# Altium footprint library CUSTOM PCB.PcbLib: 404 footprints (part 11 of 26)
Each footprint in its own frame and in the unit in brackets; x right, y up, seen from the top. Pads: shape width x height; smd on the part's side, far side on the other; paste and mask are expansions set on the pad; w line width, h text height; cw(c..) or ccw(c..) is an arc to the next point about the centre after c.
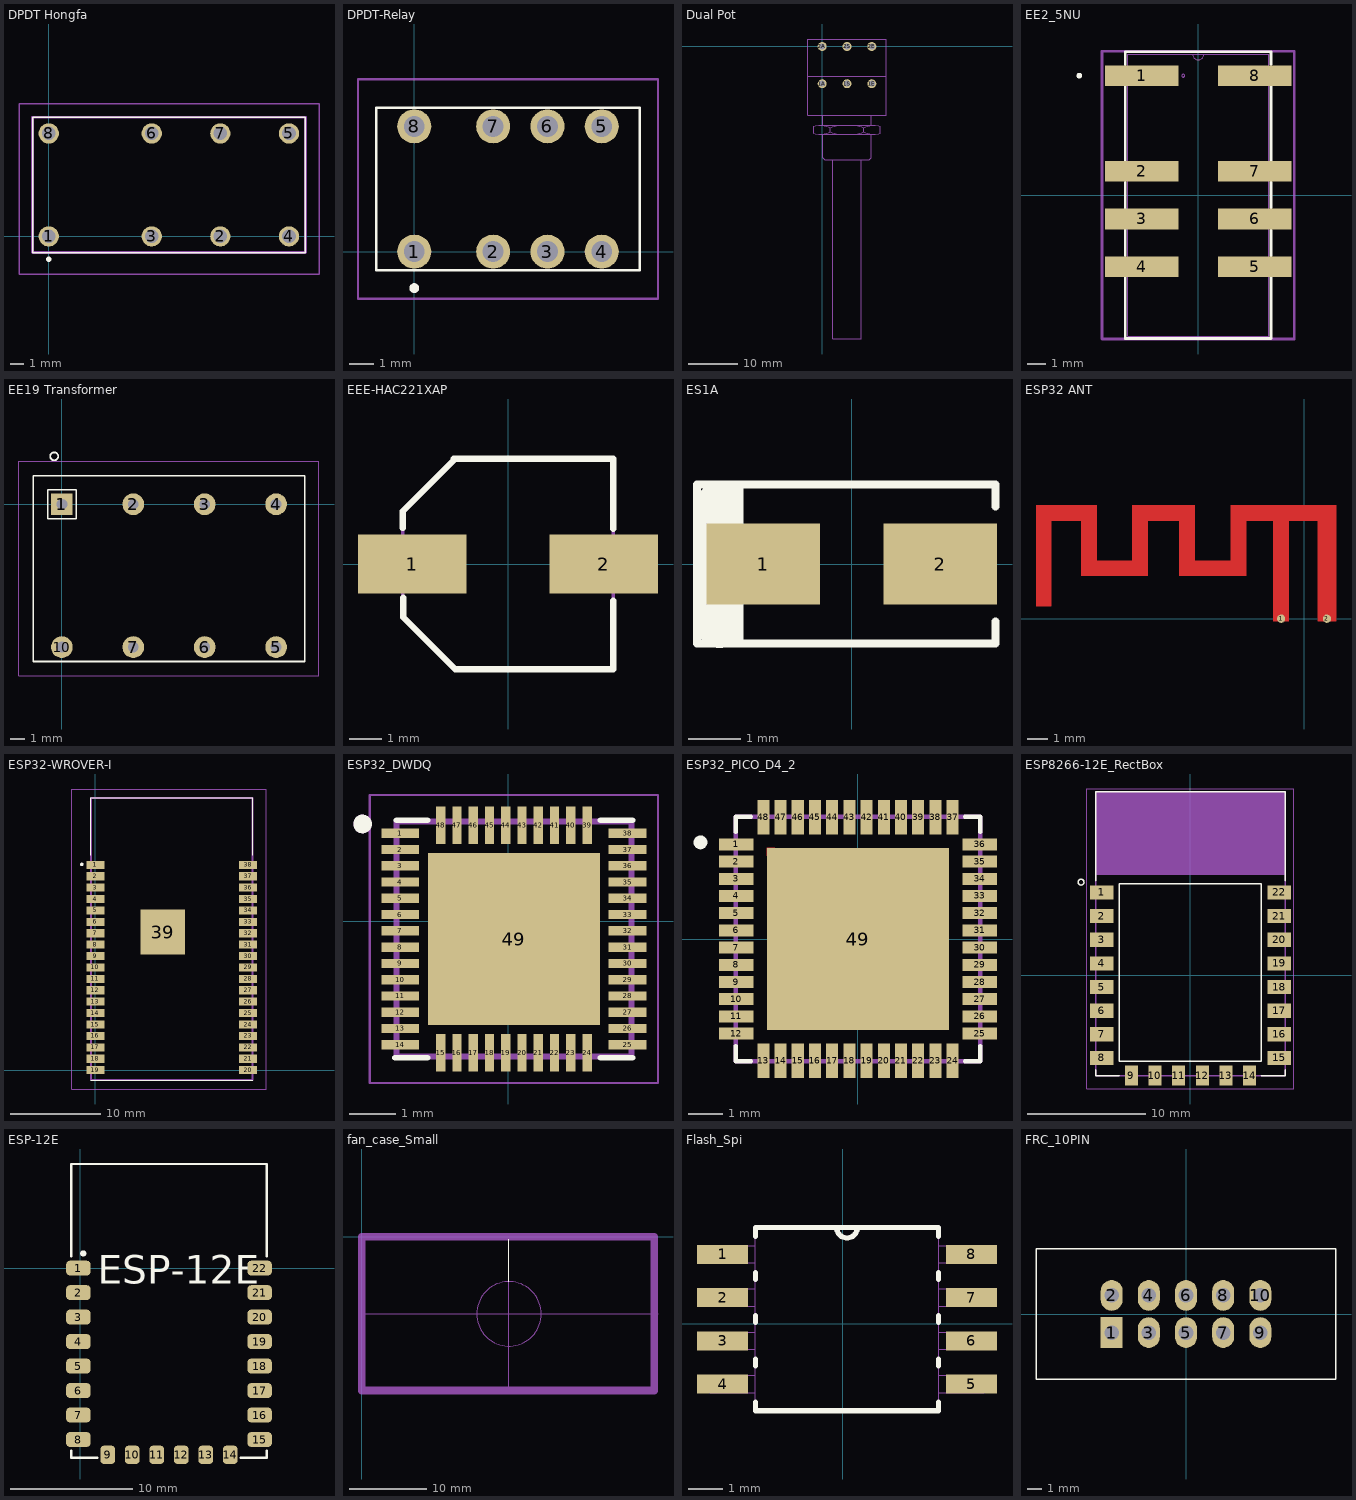
[diagram p10: the footprints below, top view; thin cyan lines are the x and y axes]

## DPDT Hongfa [mm]
pads (8):
  round 1.5 hole 1: 1(0,0) 2(12.7,0) 3(7.62,0) 4(17.78,0) 5(17.78,7.62) 6(7.62,7.62) 7(12.7,7.62) 8(0,7.62)
Top Overlay:
  lines w0.1: -1.2,-1.19 -1.2,8.81 19,8.81 19,-1.19 -1.2,-1.19
  lines w0.2: -0.1,-1.69 ccw(c0,-1.69) 0.1,-1.69 ccw(c0,-1.69) -0.1,-1.69
Mechanical 15:
  lines w0.2: -1.2,-1.19 -1.2,8.81 19,8.81 19,-1.19 -1.2,-1.19
Mechanical 20:
  lines w0.1: -2.2,-2.79 -2.2,9.81 20,9.81 20,-2.79 -2.2,-2.79
3D body: height 11.48, standoff 0, extent -1.209,-1.189 19.009,8.819

## DPDT-Relay [mm] "Signal relay kemet uc 2"
pads (8):
  round 1.381 hole 0.85: 1(0,0) 2(3.2,0) 3(5.4,0) 4(7.6,0) 5(7.6,5.08) 6(5.4,5.08) 7(3.2,5.08) 8(0,5.08)
Top Overlay:
  lines w0.1: -1.534,-0.762 9.134,-0.762 9.134,5.842 -1.534,5.842 -1.534,-0.762
  lines w0.2: -0.1,-1.478 cw(c0,-1.478) 0.1,-1.478 cw(c0,-1.478) -0.1,-1.478
Mechanical 20:
  lines w0.1: -2.28,-1.905 9.88,-1.905 9.88,6.985 -2.28,6.985 -2.28,-1.905
3D body: height 5.3, standoff 0, extent -1.524,-0.762 9.144,5.842

## Dual Pot [mm] "dual gang pot"
pads (6):
  round 1.8 / inner round 1.524 / far side round 1.8 hole 1.2: 1A(0,-7.5) 1E(10,-7.5) 1S(5,-7.5) 2A(0,0) 2E(10,0) 2S(5,0)
Mechanical 22:
  lines w0.203: 2.1,-22.9 2.1,-58.9 7.9,-58.9 7.9,-22.9 ; -2.9,-6 12.9,-6 ; -2.9,-6 -2.9,-13.9 0.1,-13.9 ; -2.9,-6 -2.9,1.5 12.9,1.5 12.9,-6 ; -0.4,-17.7 0.1,-17.7 ; -0.4,-17.7 -0.7,-17.7 -1.4,-17.6 -1.7,-17.5 -1.7,-16.1 -1.4,-16 -0.7,-15.9 -0.4,-15.9 ; -0.4,-17.7 0.4,-17.6 1.2,-17.4 1.6,-17.2 ; -0.4,-15.9 0.1,-15.9 ; -0.4,-15.9 0.4,-16 1.2,-16.2 1.6,-16.4 ; 0.1,-17.7 0.1,-22.4 0.5,-22.8 9.5,-22.8 9.9,-22.4 9.9,-17.7 ; 0.1,-17.7 3.6,-17.7 ; 0.1,-15.9 0.1,-13.9 ; 0.1,-15.9 3.6,-15.9 ; 0.1,-13.9 9.9,-13.9 ; 1.6,-17.2 2,-17.4 2.8,-17.6 3.6,-17.7 ; 1.6,-17.2 1.6,-16.4 ; 1.6,-16.4 2,-16.2 2.8,-16 3.6,-15.9 ; 3.6,-17.7 6.4,-17.7 ; 3.6,-15.9 6.4,-15.9 ; 6.4,-17.7 9.9,-17.7 ; 6.4,-17.7 7.2,-17.6 8,-17.4 8.4,-17.2 ; 6.4,-15.9 9.9,-15.9 ; 6.4,-15.9 7.2,-16 8,-16.2 8.4,-16.4 ; 8.4,-17.2 8.8,-17.4 9.6,-17.6 10.4,-17.7 ; 8.4,-17.2 8.4,-16.4 ; 8.4,-16.4 8.8,-16.2 9.6,-16 10.4,-15.9 ; 9.9,-17.7 10.4,-17.7 ; 9.9,-15.9 9.9,-13.9 ; 9.9,-15.9 10.4,-15.9 ; 9.9,-13.9 12.9,-13.9 12.9,-6.4 12.9,-6 ; 10.4,-17.7 10.7,-17.7 11.4,-17.6 11.7,-17.5 11.7,-16.1 11.4,-16 10.7,-15.9 10.4,-15.9

## EE2_5NU [mm] "Fan_Relay"
pads (8):
  rect 3.903x1.11 smd paste+0 mask+0: 1(-3.002,6.35) 2(-3.002,1.27) 3(-3.002,-1.27) 4(-3.002,-3.81) 5(3.002,-3.81) 6(3.002,-1.27) 7(3.002,1.27) 8(3.002,6.35)
Top Overlay:
  circle w0.152: c-6.325,6.35 r0.076
  lines w0.152: -3.877,-4.397 -3.877,-7.627 3.877,-7.627 3.877,-4.397 ; -3.877,-3.223 -3.877,-1.857 ; -3.877,-0.683 -3.877,0.683 ; -3.877,1.857 -3.877,5.763 ; -3.877,6.937 -3.877,7.627 3.877,7.627 3.877,6.937 ; 3.877,-3.223 3.877,-1.857 ; 3.877,-0.683 3.877,0.683 ; 3.877,1.857 3.877,5.763
Mechanical 13:
  circle w0: c-0.796,6.35 r0.076
  lines w0: -0.305,7.5 ccw(c0,7.5) 0.305,7.5
  lines w0.025: -4.75,-4.064 -4.75,-3.556 -3.75,-3.556 -3.75,-4.064 -4.75,-4.064 ; -4.75,-1.524 -4.75,-1.016 -3.75,-1.016 -3.75,-1.524 -4.75,-1.524 ; -4.75,1.016 -4.75,1.524 -3.75,1.524 -3.75,1.016 -4.75,1.016 ; -4.75,6.096 -4.75,6.604 -3.75,6.604 -3.75,6.096 -4.75,6.096 ; -3.75,-7.5 3.75,-7.5 3.75,7.5 -3.75,7.5 -3.75,-7.5 ; 3.75,-4.064 3.75,-3.556 4.75,-3.556 4.75,-4.064 3.75,-4.064 ; 3.75,-1.524 3.75,-1.016 4.75,-1.016 4.75,-1.524 3.75,-1.524 ; 3.75,1.016 3.75,1.524 4.75,1.524 4.75,1.016 3.75,1.016 ; 3.75,6.096 3.75,6.604 4.75,6.604 4.75,6.096 3.75,6.096
Mechanical 15:
  lines w0.152: -5.106,-7.652 -5.106,7.652 5.106,7.652 5.106,-7.652 -5.106,-7.652
3D body "User Library-EE2-5NU.STEP": height 10.14, standoff 0.14, extent -4.75,-7.38 4.75,7.62

## EE19 Transformer [mil] "DC/DC  converter"
pads (8):
  rect 60x60 hole 30: 1(0,0)
  round 60 hole 30: 2(196.85,0) 3(393.7,0) 4(590.55,0) 5(590.55,-393.7) 6(393.7,-393.7) 7(196.85,-393.7) 10(0,-393.7)
Top Overlay:
  circle w5: c-21,132 r11
  lines w3.94: -39.37,-39.37 39.37,-39.37 39.37,39.37 -39.37,39.37 -39.37,-39.37
  lines w5: -78.74,-433.07 -78.74,78.74 669.29,78.74 669.29,-433.07 -78.74,-433.07
Mechanical 1:
  lines w0.39: -118.11,-472.44 -118.11,118.11 708.66,118.11 708.66,-472.44 -118.11,-472.44
3D body: height 393.7, standoff 0, extent -118.11,-472.44 708.66,118.11
3D body: height 394.09, standoff 0, extent -120.35,-240.31 711.18,-102.64

## EEE-HAC221XAP [mm]
pads (2):
  rect 3.4x1.85 smd: 1(-3,0) 2(3,0)
Top Overlay:
  lines w0.2: -3.299,1.129 -3.299,1.653 -1.7,3.252 ; -3.281,-1.058 -3.281,-1.669 -1.65,-3.3 3.3,-3.3 3.3,-1.146 ; -1.7,3.3 3.3,3.3 3.3,1.106
Mechanical 13:
  lines w0.1: -3.3,-1.65 -1.65,-3.3 3.3,-3.3 3.3,3.3 -1.65,3.3 -3.3,1.65 -3.3,-1.65
3D body "User Library-ALU-D8.STEP": height 7.7, standoff 0, extent -3.5,-3.3 3.5,3.3

## ES1A [mil]
pads (2):
  rect 86x61 smd paste+0 mask+0: 1(-67,0) 2(67,0)
Top Overlay:
  lines w6: -117,32 -117,60 ; -109,60 109,60 109,43.6 ; -100,-46 -100,-49 -89,-60 109,-60 109,-43.6 ; -100,60 -117,60 ; -85,60 -85,-60 -117,-60 -117,60
  lines w35: -100,-46 -100,45
3D body "SMASeries.step": height 92.01, standoff 0, extent -104.02,-55 104.02,55

## ESP32 ANT [mm]
pads (2):
  round 0.4 smd paste-0.2: 1(-1.118,0) 2(1.118,0)
Top Layer:
  region: -1.495,-0.114 -0.741,-0.114 -0.741,4.786 0.678,4.786 0.678,-0.114 1.559,-0.114 1.559,5.54 -3.569,5.54 -3.569,2.84 -5.326,2.84 -5.326,5.54 -8.38,5.54 -8.38,2.84 -10.126,2.84 -10.126,5.54 -13.08,5.54 -13.08,0.612 -12.326,0.612 -12.326,4.786 -10.88,4.786 -10.88,2.086 -7.626,2.086 -7.626,4.786 -6.08,4.786 -6.08,2.086 -2.815,2.086 -2.815,4.786 -1.495,4.786

## ESP32-WROVER-I [mm]
pads (39):
  rect 2x0.9 smd: 1(0,22.86) 2(0,21.59) 3(0,20.32) 4(0,19.05) 5(0,17.78) 6(0,16.51) 7(0,15.24) 8(0,13.97) 9(0,12.7) 10(0,11.43) 11(0,10.16) 12(0,8.89) 13(0,7.62) 14(0,6.35) 15(0,5.08) 16(0,3.81) 17(0,2.54) 18(0,1.27) 19(0,0) 20(17,0) 21(17,1.27) 22(17,2.54) 23(17,3.81) 24(17,5.08) 25(17,6.35) 26(17,7.62) 27(17,8.89) 28(17,10.16) 29(17,11.43) 30(17,12.7) 31(17,13.97) 32(17,15.24) 33(17,16.51) 34(17,17.78) 35(17,19.05) 36(17,20.32) 37(17,21.59) 38(17,22.86)
  rect 5x5 smd: 39(7.5,15.36)
Top Overlay:
  lines w0.1: -0.5,-1.1 17.5,-1.1 ; -0.5,23.95 -0.5,30.3 17.5,30.3 17.5,23.95
  lines w0.2: -1.5,22.8 cw(c-1.5,22.9) -1.5,23 cw(c-1.5,22.9) -1.5,22.8
Mechanical 15:
  lines w0.2: -0.5,-1.1 -0.5,30.3 17.5,30.3 17.5,-1.1 -0.5,-1.1
Mechanical 20:
  lines w0.1: -2.6,-2.1 -2.6,31.3 19,31.3 19,-2.1 -2.6,-2.1
3D body "ESP32-WROVER-B (16MB)--3DModel-STEP-1.STEP": height 3.4, standoff 0, extent -0.427,-1.158 17.573,30.242

## ESP32_DWDQ [mm] "Esp32 dowd SoC"
pads (49):
  rect 0.81x0.2 smd: 1(-2.318,1.894) 2(-2.318,1.544) 3(-2.318,1.194) 4(-2.318,0.844) 5(-2.318,0.494) 6(-2.318,0.144) 7(-2.318,-0.206) 8(-2.318,-0.556) 9(-2.318,-0.906) 10(-2.318,-1.256) 11(-2.318,-1.606) 12(-2.318,-1.956) 13(-2.318,-2.306) 14(-2.318,-2.656) 25(2.572,-2.656) 26(2.572,-2.306) 27(2.572,-1.956) 28(2.572,-1.606) 29(2.572,-1.256) 30(2.572,-0.906) 31(2.572,-0.556) 32(2.572,-0.206) 33(2.572,0.144) 34(2.572,0.494) 35(2.572,0.844) 36(2.572,1.194) 37(2.572,1.544) 38(2.572,1.894)
  rect 0.2x0.81 smd: 15(-1.448,-2.826) 16(-1.098,-2.826) 17(-0.748,-2.826) 18(-0.398,-2.826) 19(-0.048,-2.826) 20(0.302,-2.826) 21(0.652,-2.826) 22(1.002,-2.826) 23(1.352,-2.826) 24(1.702,-2.826) 39(1.702,2.064) 40(1.352,2.064) 41(1.002,2.064) 42(0.652,2.064) 43(0.302,2.064) 44(-0.048,2.064) 45(-0.398,2.064) 46(-0.748,2.064) 47(-1.098,2.064) 48(-1.448,2.064)
  rect 3.7x3.7 smd: 49(0.127,-0.381)
Top Overlay:
  circle w0.2: c-3.128,2.094 r0.1
  lines w0.127: -2.428,-2.936 -1.733,-2.936 ; -2.403,2.174 -1.733,2.174 ; 1.987,-2.936 2.682,-2.936 ; 1.987,2.174 2.682,2.174
Top Paste:
  region: 0.353,1.014 1.522,1.014 1.522,-0.155 0.353,-0.155
  region: -1.273,1.014 -0.098,1.014 -0.098,-0.155 -1.273,-0.155
  region: -1.271,-0.606 -0.098,-0.606 -0.098,-1.779 -1.271,-1.779
  region: 0.353,-0.606 1.522,-0.606 1.522,-1.779 0.353,-1.779
Mechanical 1:
  circle w0.2: c-3.128,2.094 r0.1
  lines w0.127: -2.403,-2.911 2.657,-2.911 2.657,2.149 -2.403,2.149 -2.403,-2.911
Mechanical 4:
  lines w0.05: -2.973,-3.481 3.227,-3.481 3.227,2.719 -2.973,2.719 -2.973,-3.481
3D body "ESP32-D0WDQ6--3DModel-STEP-56544.STEP": height 0.85, standoff -0.05, extent -2.873,-3.381 3.127,2.619

## ESP32_PICO_D4_2 [mm]
pads (49):
  rect 1x0.35 smd: 1(-3.54,2.75) 2(-3.54,2.25) 3(-3.54,1.75) 4(-3.54,1.25) 5(-3.54,0.75) 6(-3.54,0.25) 7(-3.54,-0.25) 8(-3.54,-0.75) 9(-3.54,-1.25) 10(-3.54,-1.75) 11(-3.54,-2.25) 12(-3.54,-2.75) 25(3.54,-2.75) 26(3.54,-2.25) 27(3.54,-1.75) 28(3.54,-1.25) 29(3.54,-0.75) 30(3.54,-0.25) 31(3.54,0.25) 32(3.54,0.75) 33(3.54,1.25) 34(3.54,1.75) 35(3.54,2.25) 36(3.54,2.75)
  rect 0.35x1 smd: 13(-2.75,-3.54) 14(-2.25,-3.54) 15(-1.75,-3.54) 16(-1.25,-3.54) 17(-0.75,-3.54) 18(-0.25,-3.54) 19(0.25,-3.54) 20(0.75,-3.54) 21(1.25,-3.54) 22(1.75,-3.54) 23(2.25,-3.54) 24(2.75,-3.54) 37(2.75,3.54) 38(2.25,3.54) 39(1.75,3.54) 40(1.25,3.54) 41(0.75,3.54) 42(0.25,3.54) 43(-0.25,3.54) 44(-0.75,3.54) 45(-1.25,3.54) 46(-1.75,3.54) 47(-2.25,3.54) 48(-2.75,3.54)
  rect 5.3x5.3 smd: 49(0,0)
Top Layer:
  pour cut-out: -2.652,2.422 -2.423,2.651 -2.653,2.651
Top Overlay:
  circle w0.2: c-4.578,2.808 r0.1
  lines w0.127: -3.55,-3.11 -3.55,-3.55 -3.11,-3.55 ; -3.55,3.11 -3.55,3.55 -3.11,3.55 ; 3.11,-3.55 3.55,-3.55 3.55,-3.11 ; 3.11,3.55 3.55,3.55 3.55,3.11
Top Paste:
  region: -1.166,1.162 1.162,1.162 1.162,-1.166 -1.166,-1.166
Mechanical 1:
  lines w0.127: -3.55,-3.55 3.55,-3.55 3.55,3.55 -3.55,3.55 -3.55,-3.55
3D body "esp32picolow.SLDPRT": height 0.26, standoff -0.01, extent -3.5,-3.5 3.5,3.5

## ESP8266-12E_RectBox [mm] "ESP-12E Rectangular Box"
pads (22):
  rect 2x1.2 smd: 1(-7.5,7) 2(-7.5,5) 3(-7.5,3) 4(-7.5,1) 5(-7.5,-1) 6(-7.5,-3) 7(-7.5,-5) 8(-7.5,-7) 15(7.5,-7) 16(7.5,-5) 17(7.5,-3) 18(7.5,-1) 19(7.5,1) 20(7.5,3) 21(7.5,5) 22(7.5,7)
  rect 1.1x1.7 smd: 9(-5,-8.5) 10(-3,-8.5) 11(-1,-8.5) 12(1,-8.5) 13(3,-8.5) 14(5,-8.5)
Top Overlay:
  circle w0.127: c-9.25,7.875 r0.25
  lines w0.127: -8,-8 -8,-8.5 -6,-8.5 ; -8,8 -8,15.5 8,15.5 8,8 ; 6,-8.5 8,-8.5 8,-8 ; -6,-7.26 6,-7.26 6,7.74 -6,7.74 -6,-7.26
Mechanical 1:
  region: -8.006,15.5 8,15.5 8,8.507 -8.006,8.507
  region: -8.004,15.5 8,15.5 8,8.504 -8.004,8.504
  lines w0.05: -8.75,-9.625 8.75,-9.625 8.75,15.75 -8.75,15.75 -8.75,-9.625
  lines w0.127: -8,-8.5 8,-8.5 8,15.5 -8,15.5 -8,-8.5
3D body: height 5, standoff 0, extent -8.75,-9.625 8.75,15.75

## ESP-12E [mm]
pads (22):
  rrect50% 2x1.2 smd: 1(-0.15,0) 2(-0.15,-2) 3(-0.15,-4) 4(-0.15,-6) 5(-0.15,-8) 6(-0.15,-10) 7(-0.15,-12) 8(-0.15,-14) 15(14.65,-14) 16(14.65,-12) 17(14.65,-10) 18(14.65,-8) 19(14.65,-6) 20(14.65,-4) 21(14.65,-2) 22(14.65,0)
  rrect50% 1.2x1.5 smd: 9(2.25,-15.25) 10(4.25,-15.25) 11(6.25,-15.25) 12(8.25,-15.25) 13(10.25,-15.25) 14(12.25,-15.25)
Top Overlay:
  circle w0.254: c0.25,1.2 r0.127
  lines w0.2: -0.75,-14.925 -0.75,-15.5 1.4,-15.5 ; -0.75,0.975 -0.75,8.5 15.25,8.5 15.25,0.975 ; 13.125,-15.5 15.25,-15.5 15.25,-14.925
  text "ESP-12E" at 1.425,-2.075 h4
3D body "ESP-12E.stp": height 3.01, standoff 0, extent -0.76,-15.51 15.26,8.5

## fan_case_Small [mm]
Top Overlay:
  lines w0.127: 19.101,-5.842 19.101,-0.33
Mechanical 2:
  circle w0.1: c19.152,-10.033 r4.2
  lines w0.127: -0.508,-10.033 38.557,-10.033 ; 19.152,-20.523 19.152,0.432
Mechanical 8:
  lines w0.127: 0,-20.015 0,-19.66
  lines w1: 0,-20.015 38.075,-20.015 38.075,0 0,0 0,-19.66
3D body: height 39, standoff 0, extent -0.508,-0.483 38.583,0.483
3D body: height 39, standoff 0, extent -0.508,-20.523 38.583,-19.558
3D body: height 39, standoff 0, extent 37.567,-19.558 38.583,-0.483
3D body: height 39, standoff 0, extent -0.508,-19.558 0.508,-0.483
3D body: height 2.4, standoff 0, extent 19.152,-5.842 19.152,-5.842
3D body: height 2.4, standoff 0, extent 19.152,-5.842 19.152,-5.842
3D body: height 1.27, standoff 0, extent 0.533,-19.507 37.592,-0.432

## Flash_Spi [mil] "Flash memory 4mb Sop8"
pads (8):
  rect 59x22 smd: 1(-139,80) 2(-139,30) 3(-139,-20) 4(-139,-70) 5(149,-70) 6(149,-20) 7(149,30) 8(149,80)
Top Overlay:
  lines w6: -101,-91 -101,-101 111,-101 111,-91 ; -101,-49 -101,-41 ; -101,1 -101,9 ; -101,51 -101,59 ; -101,101 -101,111 -7,111 ; 111,-49 111,-41 ; 111,1 111,9 ; 111,51 111,59 ; 111,101 111,111 17,111 ; -7,111 ccw(c5,111) 17,111 ; -7,111 17,111
Mechanical 1:
  lines w0: -7,111 ccw(c5,111) 17,111 ; -7,111 -101,111 -101,-101 111,-101 111,111 17,111 ; -7,111 17,111 ; -154,-80 -101,-80 -101,-60 -154,-60 -154,-80 ; -154,-30 -101,-30 -101,-10 -154,-10 -154,-30 ; -154,20 -101,20 -101,40 -154,40 -154,20 ; -154,70 -101,70 -101,90 -154,90 -154,70 ; 111,-80 164,-80 164,-60 111,-60 111,-80 ; 111,-30 164,-30 164,-10 111,-10 111,-30 ; 111,20 164,20 164,40 111,40 111,20 ; 111,70 164,70 164,90 111,90 111,70
3D body "User Library-so8-3.STEP": height 63.43, standoff -3.5, extent -113.11,-91.46 123.11,101.46
3D body "User Library-so8-3.STEP": height 66.93, standoff 0, extent -113.11,-91.46 123.11,101.46
3D body: height 10, standoff 0, extent -40,60 -40,60
3D body: height 10, standoff 0, extent -40,60 -40,60

## FRC_10PIN [mm]
pads (10):
  rect 1.5x2.1 hole 1: 1(-5.08,-1.27)
  oval 1.5x2.1 hole 1: 2(-5.08,1.27) 3(-2.54,-1.27) 4(-2.54,1.27) 5(0,-1.27) 6(0,1.27) 7(2.54,-1.27) 8(2.54,1.27) 9(5.08,-1.27) 10(5.08,1.27)
Top Overlay:
  lines w0.1: -10.25,-4.45 10.25,-4.45 10.25,4.45 -10.25,4.45 -10.25,-4.45
3D body "DS1013-10S (IDC-10MS CONNFLY).stp": height 9, standoff -3.6, extent -10.25,-4.45 10.25,4.45